# Altium footprint library Connector_Samtec_HLE_THT.PcbLib: 141 footprints (part 7 of 9)
Each footprint in its own frame and in the unit in brackets; x right, y up, seen from the top. Pads: shape width x height; smd on the part's side, far side on the other; paste and mask are expansions set on the pad; w line width, h text height; cw(c..) or ccw(c..) is an arc to the next point about the centre after c.
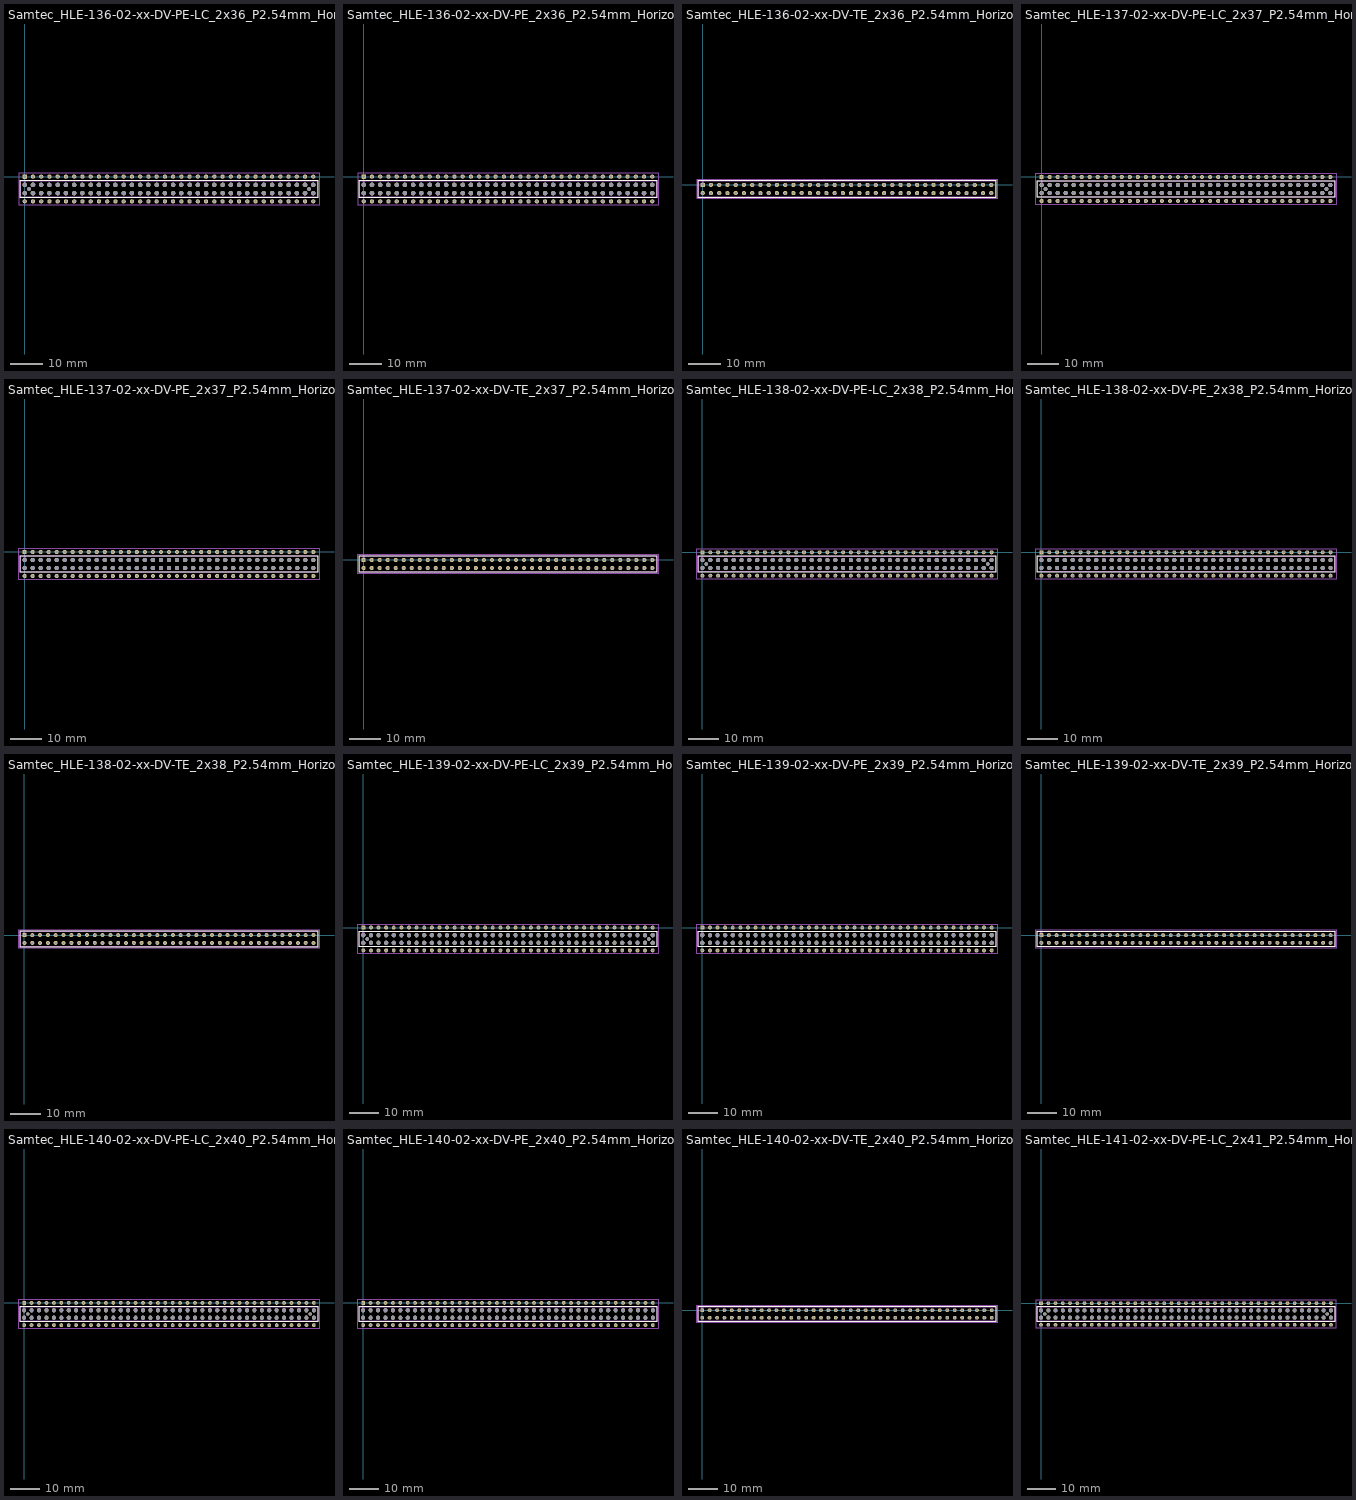
[diagram p6: the footprints below, top view; thin cyan lines are the x and y axes]

## Samtec_HLE-136-02-xx-DV-PE-LC_2x36_P2.54mm_Horizontal [mm]
pads (146):
  rrect19% 1.31x1.31 hole 0.71: 1(0,0)
  round 1.31 hole 0.71: 2(0,-7.62) 3(2.54,0) 4(2.54,-7.62) 5(5.08,0) 6(5.08,-7.62) 7(7.62,0) 8(7.62,-7.62) 9(10.16,0) 10(10.16,-7.62) 11(12.7,0) 12(12.7,-7.62) 13(15.24,0) 14(15.24,-7.62) 15(17.78,0) 16(17.78,-7.62) 17(20.32,0) 18(20.32,-7.62) 19(22.86,0) 20(22.86,-7.62) 21(25.4,0) 22(25.4,-7.62) 23(27.94,0) 24(27.94,-7.62) 25(30.48,0) 26(30.48,-7.62) 27(33.02,0) 28(33.02,-7.62) 29(35.56,0) 30(35.56,-7.62) 31(38.1,0) 32(38.1,-7.62) 33(40.64,0) 34(40.64,-7.62) 35(43.18,0) 36(43.18,-7.62) 37(45.72,0) 38(45.72,-7.62) 39(48.26,0) 40(48.26,-7.62) 41(50.8,0) 42(50.8,-7.62) 43(53.34,0) 44(53.34,-7.62) 45(55.88,0) 46(55.88,-7.62) 47(58.42,0) 48(58.42,-7.62) 49(60.96,0) 50(60.96,-7.62) 51(63.5,0) 52(63.5,-7.62) 53(66.04,0) 54(66.04,-7.62) 55(68.58,0) 56(68.58,-7.62) 57(71.12,0) 58(71.12,-7.62) 59(73.66,0) 60(73.66,-7.62) 61(76.2,0) 62(76.2,-7.62) 63(78.74,0) 64(78.74,-7.62) 65(81.28,0) 66(81.28,-7.62) 67(83.82,0) 68(83.82,-7.62) 69(86.36,0) 70(86.36,-7.62) 71(88.9,0) 72(88.9,-7.62)
  round 1.4 hole 1.4: Un1(55.88,-5.08) Un2(7.62,-2.54) Un3(10.16,-5.08) Un4(58.42,-5.08) Un5(58.42,-2.54) Un6(71.12,-5.08) Un7(27.94,-2.54) Un8(17.78,-5.08) Un9(20.32,-5.08) Un10(63.5,-5.08) Un11(27.94,-5.08) Un13(83.82,-5.08) Un14(78.74,-5.08) Un15(88.9,-2.54) Un16(30.48,-2.54) Un17(7.62,-5.08) Un18(22.86,-5.08) Un19(63.5,-2.54) Un20(60.96,-5.08) Un21(48.26,-2.54) Un22(66.04,-2.54) Un23(5.08,-2.54) Un24(53.34,-2.54) Un25(2.54,-2.54) Un26(35.56,-2.54) Un27(73.66,-5.08) Un28(10.16,-2.54) Un29(86.36,-5.08) Un30(76.2,-5.08) Un31(45.72,-2.54) Un32(12.7,-2.54) Un33(43.18,-2.54) Un35(22.86,-2.54) Un36(66.04,-5.08) Un37(15.24,-2.54) Un38(68.58,-2.54) Un39(38.1,-2.54) Un40(40.64,-2.54) Un41(68.58,-5.08) Un42(5.08,-5.08) Un43(53.34,-5.08) Un44(15.24,-5.08) Un45(88.9,-5.08) Un46(25.4,-2.54) Un47(2.54,-5.08) Un48(30.48,-5.08) Un49(33.02,-5.08) Un50(45.72,-5.08) Un51(40.64,-5.08) Un52(48.26,-5.08) Un53(76.2,-2.54) Un54(25.4,-5.08) Un55(17.78,-2.54) Un56(50.8,-2.54) Un57(81.28,-5.08) Un58(86.36,-2.54) Un59(0,-2.54) Un60(60.96,-2.54) Un61(35.56,-5.08) Un62(50.8,-5.08) Un63(55.88,-2.54) Un64(20.32,-2.54) Un65(83.82,-2.54) Un66(0,-5.08) Un67(33.02,-2.54) Un68(71.12,-2.54) Un69(81.28,-2.54) Un70(73.66,-2.54) Un71(38.1,-5.08) Un72(43.18,-5.08) Un73(12.7,-5.08) Un74(78.74,-2.54)
  round 1.19 hole 1.19: Un12(87.63,-3.81) Un34(1.27,-3.81)
F.SilkS:
  lines w0.12: -1.38,-6.46 -1.38,-1.16 90.28,-1.16 90.28,-6.46 -1.38,-6.46
F.CrtYd:
  lines w0.05: -1.77,-8.78 90.67,-8.78 90.67,1.16 -1.77,1.16 -1.77,-8.78
F.Fab:
  lines w0.1: -0.5,-1.27 0,-1.977 0.5,-1.27 ; -1.27,-6.35 90.17,-6.35 90.17,-1.27 -1.27,-1.27 -1.27,-6.35
  text "'.Designator'" at 40.403,-6.49 h1

## Samtec_HLE-136-02-xx-DV-PE_2x36_P2.54mm_Horizontal [mm]
pads (144):
  rrect19% 1.31x1.31 hole 0.71: 1(0,0)
  round 1.31 hole 0.71: 2(0,-7.62) 3(2.54,0) 4(2.54,-7.62) 5(5.08,0) 6(5.08,-7.62) 7(7.62,0) 8(7.62,-7.62) 9(10.16,0) 10(10.16,-7.62) 11(12.7,0) 12(12.7,-7.62) 13(15.24,0) 14(15.24,-7.62) 15(17.78,0) 16(17.78,-7.62) 17(20.32,0) 18(20.32,-7.62) 19(22.86,0) 20(22.86,-7.62) 21(25.4,0) 22(25.4,-7.62) 23(27.94,0) 24(27.94,-7.62) 25(30.48,0) 26(30.48,-7.62) 27(33.02,0) 28(33.02,-7.62) 29(35.56,0) 30(35.56,-7.62) 31(38.1,0) 32(38.1,-7.62) 33(40.64,0) 34(40.64,-7.62) 35(43.18,0) 36(43.18,-7.62) 37(45.72,0) 38(45.72,-7.62) 39(48.26,0) 40(48.26,-7.62) 41(50.8,0) 42(50.8,-7.62) 43(53.34,0) 44(53.34,-7.62) 45(55.88,0) 46(55.88,-7.62) 47(58.42,0) 48(58.42,-7.62) 49(60.96,0) 50(60.96,-7.62) 51(63.5,0) 52(63.5,-7.62) 53(66.04,0) 54(66.04,-7.62) 55(68.58,0) 56(68.58,-7.62) 57(71.12,0) 58(71.12,-7.62) 59(73.66,0) 60(73.66,-7.62) 61(76.2,0) 62(76.2,-7.62) 63(78.74,0) 64(78.74,-7.62) 65(81.28,0) 66(81.28,-7.62) 67(83.82,0) 68(83.82,-7.62) 69(86.36,0) 70(86.36,-7.62) 71(88.9,0) 72(88.9,-7.62)
  round 1.4 hole 1.4: Un1(55.88,-2.54) Un2(76.2,-2.54) Un3(63.5,-2.54) Un4(76.2,-5.08) Un5(43.18,-2.54) Un6(68.58,-5.08) Un7(12.7,-2.54) Un8(0,-2.54) Un9(10.16,-5.08) Un10(2.54,-2.54) Un11(48.26,-2.54) Un12(60.96,-2.54) Un13(73.66,-2.54) Un14(43.18,-5.08) Un15(81.28,-2.54) Un16(38.1,-2.54) Un17(78.74,-5.08) Un18(83.82,-2.54) Un19(53.34,-2.54) Un20(71.12,-2.54) Un21(88.9,-2.54) Un22(35.56,-2.54) Un23(10.16,-2.54) Un24(33.02,-2.54) Un25(22.86,-5.08) Un26(15.24,-5.08) Un27(63.5,-5.08) Un28(86.36,-5.08) Un29(25.4,-2.54) Un30(35.56,-5.08) Un31(45.72,-5.08) Un32(25.4,-5.08) Un33(20.32,-5.08) Un34(68.58,-2.54) Un35(38.1,-5.08) Un36(50.8,-2.54) Un37(20.32,-2.54) Un38(50.8,-5.08) Un39(17.78,-5.08) Un40(7.62,-5.08) Un41(15.24,-2.54) Un42(22.86,-2.54) Un43(2.54,-5.08) Un44(53.34,-5.08) Un45(30.48,-2.54) Un46(81.28,-5.08) Un47(45.72,-2.54) Un48(0,-5.08) Un49(40.64,-2.54) Un50(48.26,-5.08) Un51(86.36,-2.54) Un52(40.64,-5.08) Un53(33.02,-5.08) Un54(83.82,-5.08) Un55(78.74,-2.54) Un56(66.04,-5.08) Un57(27.94,-2.54) Un58(66.04,-2.54) Un59(58.42,-5.08) Un60(30.48,-5.08) Un61(55.88,-5.08) Un62(17.78,-2.54) Un63(73.66,-5.08) Un64(71.12,-5.08) Un65(5.08,-2.54) Un66(7.62,-2.54) Un67(88.9,-5.08) Un68(12.7,-5.08) Un69(5.08,-5.08) Un70(60.96,-5.08) Un71(27.94,-5.08) Un72(58.42,-2.54)
F.SilkS:
  lines w0.12: -1.38,-6.46 90.28,-6.46 90.28,-1.16 -1.38,-1.16 -1.38,-6.46
F.CrtYd:
  lines w0.05: -1.77,-8.78 -1.77,1.16 90.67,1.16 90.67,-8.78 -1.77,-8.78
F.Fab:
  lines w0.1: -0.5,-1.27 0,-1.977 0.5,-1.27 ; -1.27,-6.35 90.17,-6.35 90.17,-1.27 -1.27,-1.27 -1.27,-6.35
  text "'.Designator'" at 40.403,-6.49 h1

## Samtec_HLE-136-02-xx-DV-TE_2x36_P2.54mm_Horizontal [mm]
pads (72):
  rrect19% 1.31x1.31 hole 0.71: 1(0,0)
  round 1.31 hole 0.71: 2(0,-2.54) 3(2.54,0) 4(2.54,-2.54) 5(5.08,0) 6(5.08,-2.54) 7(7.62,0) 8(7.62,-2.54) 9(10.16,0) 10(10.16,-2.54) 11(12.7,0) 12(12.7,-2.54) 13(15.24,0) 14(15.24,-2.54) 15(17.78,0) 16(17.78,-2.54) 17(20.32,0) 18(20.32,-2.54) 19(22.86,0) 20(22.86,-2.54) 21(25.4,0) 22(25.4,-2.54) 23(27.94,0) 24(27.94,-2.54) 25(30.48,0) 26(30.48,-2.54) 27(33.02,0) 28(33.02,-2.54) 29(35.56,0) 30(35.56,-2.54) 31(38.1,0) 32(38.1,-2.54) 33(40.64,0) 34(40.64,-2.54) 35(43.18,0) 36(43.18,-2.54) 37(45.72,0) 38(45.72,-2.54) 39(48.26,0) 40(48.26,-2.54) 41(50.8,0) 42(50.8,-2.54) 43(53.34,0) 44(53.34,-2.54) 45(55.88,0) 46(55.88,-2.54) 47(58.42,0) 48(58.42,-2.54) 49(60.96,0) 50(60.96,-2.54) 51(63.5,0) 52(63.5,-2.54) 53(66.04,0) 54(66.04,-2.54) 55(68.58,0) 56(68.58,-2.54) 57(71.12,0) 58(71.12,-2.54) 59(73.66,0) 60(73.66,-2.54) 61(76.2,0) 62(76.2,-2.54) 63(78.74,0) 64(78.74,-2.54) 65(81.28,0) 66(81.28,-2.54) 67(83.82,0) 68(83.82,-2.54) 69(86.36,0) 70(86.36,-2.54) 71(88.9,0) 72(88.9,-2.54)
F.SilkS:
  lines w0.12: -1.38,-3.92 -1.38,1.38 90.28,1.38 90.28,-3.92 -1.38,-3.92
F.CrtYd:
  lines w0.05: -1.77,-4.31 90.67,-4.31 90.67,1.77 -1.77,1.77 -1.77,-4.31
F.Fab:
  lines w0.1: -0.5,1.27 0,0.563 0.5,1.27 ; -1.27,-3.81 -1.27,1.27 90.17,1.27 90.17,-3.81 -1.27,-3.81
  text "'.Designator'" at 40.403,-3.95 h1

## Samtec_HLE-137-02-xx-DV-PE-LC_2x37_P2.54mm_Horizontal [mm]
pads (150):
  rrect19% 1.31x1.31 hole 0.71: 1(0,0)
  round 1.31 hole 0.71: 2(0,-7.62) 3(2.54,0) 4(2.54,-7.62) 5(5.08,0) 6(5.08,-7.62) 7(7.62,0) 8(7.62,-7.62) 9(10.16,0) 10(10.16,-7.62) 11(12.7,0) 12(12.7,-7.62) 13(15.24,0) 14(15.24,-7.62) 15(17.78,0) 16(17.78,-7.62) 17(20.32,0) 18(20.32,-7.62) 19(22.86,0) 20(22.86,-7.62) 21(25.4,0) 22(25.4,-7.62) 23(27.94,0) 24(27.94,-7.62) 25(30.48,0) 26(30.48,-7.62) 27(33.02,0) 28(33.02,-7.62) 29(35.56,0) 30(35.56,-7.62) 31(38.1,0) 32(38.1,-7.62) 33(40.64,0) 34(40.64,-7.62) 35(43.18,0) 36(43.18,-7.62) 37(45.72,0) 38(45.72,-7.62) 39(48.26,0) 40(48.26,-7.62) 41(50.8,0) 42(50.8,-7.62) 43(53.34,0) 44(53.34,-7.62) 45(55.88,0) 46(55.88,-7.62) 47(58.42,0) 48(58.42,-7.62) 49(60.96,0) 50(60.96,-7.62) 51(63.5,0) 52(63.5,-7.62) 53(66.04,0) 54(66.04,-7.62) 55(68.58,0) 56(68.58,-7.62) 57(71.12,0) 58(71.12,-7.62) 59(73.66,0) 60(73.66,-7.62) 61(76.2,0) 62(76.2,-7.62) 63(78.74,0) 64(78.74,-7.62) 65(81.28,0) 66(81.28,-7.62) 67(83.82,0) 68(83.82,-7.62) 69(86.36,0) 70(86.36,-7.62) 71(88.9,0) 72(88.9,-7.62) 73(91.44,0) 74(91.44,-7.62)
  round 1.4 hole 1.4: Un1(81.28,-5.08) Un2(2.54,-5.08) Un3(43.18,-2.54) Un4(55.88,-5.08) Un5(25.4,-5.08) Un6(27.94,-2.54) Un7(17.78,-2.54) Un8(53.34,-5.08) Un9(48.26,-5.08) Un10(66.04,-5.08) Un11(76.2,-5.08) Un12(76.2,-2.54) Un14(83.82,-5.08) Un15(45.72,-5.08) Un16(71.12,-2.54) Un18(12.7,-5.08) Un19(86.36,-5.08) Un20(10.16,-5.08) Un21(91.44,-2.54) Un22(83.82,-2.54) Un23(7.62,-5.08) Un24(71.12,-5.08) Un25(43.18,-5.08) Un26(27.94,-5.08) Un27(7.62,-2.54) Un28(58.42,-5.08) Un29(10.16,-2.54) Un30(88.9,-5.08) Un31(53.34,-2.54) Un32(73.66,-5.08) Un33(60.96,-2.54) Un34(5.08,-5.08) Un35(33.02,-2.54) Un36(78.74,-5.08) Un37(55.88,-2.54) Un38(45.72,-2.54) Un39(58.42,-2.54) Un40(20.32,-5.08) Un41(15.24,-5.08) Un42(66.04,-2.54) Un43(2.54,-2.54) Un44(0,-5.08) Un45(30.48,-5.08) Un46(91.44,-5.08) Un47(50.8,-2.54) Un48(12.7,-2.54) Un49(38.1,-5.08) Un50(25.4,-2.54) Un51(68.58,-5.08) Un52(73.66,-2.54) Un53(60.96,-5.08) Un54(15.24,-2.54) Un55(40.64,-5.08) Un56(35.56,-5.08) Un57(20.32,-2.54) Un58(86.36,-2.54) Un59(30.48,-2.54) Un60(40.64,-2.54) Un61(48.26,-2.54) Un62(33.02,-5.08) Un63(81.28,-2.54) Un64(63.5,-2.54) Un65(0,-2.54) Un66(63.5,-5.08) Un67(50.8,-5.08) Un68(22.86,-2.54) Un69(5.08,-2.54) Un70(78.74,-2.54) Un71(38.1,-2.54) Un72(35.56,-2.54) Un73(22.86,-5.08) Un74(17.78,-5.08) Un75(68.58,-2.54) Un76(88.9,-2.54)
  round 1.19 hole 1.19: Un13(90.17,-3.81) Un17(1.27,-3.81)
F.SilkS:
  lines w0.12: -1.38,-6.46 -1.38,-1.16 92.82,-1.16 92.82,-6.46 -1.38,-6.46
F.CrtYd:
  lines w0.05: -1.77,-8.78 93.21,-8.78 93.21,1.16 -1.77,1.16 -1.77,-8.78
F.Fab:
  lines w0.1: -0.5,-1.27 0,-1.977 0.5,-1.27 ; -1.27,-6.35 -1.27,-1.27 92.71,-1.27 92.71,-6.35 -1.27,-6.35
  text "'.Designator'" at 41.673,-6.49 h1

## Samtec_HLE-137-02-xx-DV-PE_2x37_P2.54mm_Horizontal [mm]
pads (148):
  rrect19% 1.31x1.31 hole 0.71: 1(0,0)
  round 1.31 hole 0.71: 2(0,-7.62) 3(2.54,0) 4(2.54,-7.62) 5(5.08,0) 6(5.08,-7.62) 7(7.62,0) 8(7.62,-7.62) 9(10.16,0) 10(10.16,-7.62) 11(12.7,0) 12(12.7,-7.62) 13(15.24,0) 14(15.24,-7.62) 15(17.78,0) 16(17.78,-7.62) 17(20.32,0) 18(20.32,-7.62) 19(22.86,0) 20(22.86,-7.62) 21(25.4,0) 22(25.4,-7.62) 23(27.94,0) 24(27.94,-7.62) 25(30.48,0) 26(30.48,-7.62) 27(33.02,0) 28(33.02,-7.62) 29(35.56,0) 30(35.56,-7.62) 31(38.1,0) 32(38.1,-7.62) 33(40.64,0) 34(40.64,-7.62) 35(43.18,0) 36(43.18,-7.62) 37(45.72,0) 38(45.72,-7.62) 39(48.26,0) 40(48.26,-7.62) 41(50.8,0) 42(50.8,-7.62) 43(53.34,0) 44(53.34,-7.62) 45(55.88,0) 46(55.88,-7.62) 47(58.42,0) 48(58.42,-7.62) 49(60.96,0) 50(60.96,-7.62) 51(63.5,0) 52(63.5,-7.62) 53(66.04,0) 54(66.04,-7.62) 55(68.58,0) 56(68.58,-7.62) 57(71.12,0) 58(71.12,-7.62) 59(73.66,0) 60(73.66,-7.62) 61(76.2,0) 62(76.2,-7.62) 63(78.74,0) 64(78.74,-7.62) 65(81.28,0) 66(81.28,-7.62) 67(83.82,0) 68(83.82,-7.62) 69(86.36,0) 70(86.36,-7.62) 71(88.9,0) 72(88.9,-7.62) 73(91.44,0) 74(91.44,-7.62)
  round 1.4 hole 1.4: Un1(73.66,-2.54) Un2(30.48,-2.54) Un3(78.74,-2.54) Un4(33.02,-2.54) Un5(2.54,-2.54) Un6(63.5,-5.08) Un7(60.96,-5.08) Un8(83.82,-2.54) Un9(2.54,-5.08) Un10(48.26,-2.54) Un11(81.28,-5.08) Un12(60.96,-2.54) Un13(10.16,-5.08) Un14(15.24,-2.54) Un15(73.66,-5.08) Un16(22.86,-2.54) Un17(76.2,-5.08) Un18(58.42,-2.54) Un19(25.4,-5.08) Un20(50.8,-5.08) Un21(86.36,-2.54) Un22(53.34,-2.54) Un23(91.44,-2.54) Un24(30.48,-5.08) Un25(68.58,-2.54) Un26(53.34,-5.08) Un27(63.5,-2.54) Un28(68.58,-5.08) Un29(5.08,-5.08) Un30(45.72,-5.08) Un31(0,-5.08) Un32(40.64,-5.08) Un33(81.28,-2.54) Un34(91.44,-5.08) Un35(35.56,-5.08) Un36(55.88,-5.08) Un37(43.18,-5.08) Un38(48.26,-5.08) Un39(17.78,-2.54) Un40(86.36,-5.08) Un41(66.04,-2.54) Un42(55.88,-2.54) Un43(88.9,-2.54) Un44(12.7,-5.08) Un45(50.8,-2.54) Un46(7.62,-5.08) Un47(66.04,-5.08) Un48(12.7,-2.54) Un49(27.94,-2.54) Un50(20.32,-2.54) Un51(43.18,-2.54) Un52(25.4,-2.54) Un53(27.94,-5.08) Un54(71.12,-2.54) Un55(40.64,-2.54) Un56(15.24,-5.08) Un57(76.2,-2.54) Un58(83.82,-5.08) Un59(20.32,-5.08) Un60(7.62,-2.54) Un61(10.16,-2.54) Un62(17.78,-5.08) Un63(5.08,-2.54) Un64(33.02,-5.08) Un65(0,-2.54) Un66(38.1,-5.08) Un67(58.42,-5.08) Un68(71.12,-5.08) Un69(78.74,-5.08) Un70(88.9,-5.08) Un71(35.56,-2.54) Un72(22.86,-5.08) Un73(45.72,-2.54) Un74(38.1,-2.54)
F.SilkS:
  lines w0.12: -1.38,-6.46 -1.38,-1.16 92.82,-1.16 92.82,-6.46 -1.38,-6.46
F.CrtYd:
  lines w0.05: -1.77,-8.78 93.21,-8.78 93.21,1.16 -1.77,1.16 -1.77,-8.78
F.Fab:
  lines w0.1: -0.5,-1.27 0,-1.977 0.5,-1.27 ; -1.27,-6.35 92.71,-6.35 92.71,-1.27 -1.27,-1.27 -1.27,-6.35
  text "'.Designator'" at 41.673,-6.49 h1

## Samtec_HLE-137-02-xx-DV-TE_2x37_P2.54mm_Horizontal [mm]
pads (74):
  rrect19% 1.31x1.31 hole 0.71: 1(0,0)
  round 1.31 hole 0.71: 2(0,-2.54) 3(2.54,0) 4(2.54,-2.54) 5(5.08,0) 6(5.08,-2.54) 7(7.62,0) 8(7.62,-2.54) 9(10.16,0) 10(10.16,-2.54) 11(12.7,0) 12(12.7,-2.54) 13(15.24,0) 14(15.24,-2.54) 15(17.78,0) 16(17.78,-2.54) 17(20.32,0) 18(20.32,-2.54) 19(22.86,0) 20(22.86,-2.54) 21(25.4,0) 22(25.4,-2.54) 23(27.94,0) 24(27.94,-2.54) 25(30.48,0) 26(30.48,-2.54) 27(33.02,0) 28(33.02,-2.54) 29(35.56,0) 30(35.56,-2.54) 31(38.1,0) 32(38.1,-2.54) 33(40.64,0) 34(40.64,-2.54) 35(43.18,0) 36(43.18,-2.54) 37(45.72,0) 38(45.72,-2.54) 39(48.26,0) 40(48.26,-2.54) 41(50.8,0) 42(50.8,-2.54) 43(53.34,0) 44(53.34,-2.54) 45(55.88,0) 46(55.88,-2.54) 47(58.42,0) 48(58.42,-2.54) 49(60.96,0) 50(60.96,-2.54) 51(63.5,0) 52(63.5,-2.54) 53(66.04,0) 54(66.04,-2.54) 55(68.58,0) 56(68.58,-2.54) 57(71.12,0) 58(71.12,-2.54) 59(73.66,0) 60(73.66,-2.54) 61(76.2,0) 62(76.2,-2.54) 63(78.74,0) 64(78.74,-2.54) 65(81.28,0) 66(81.28,-2.54) 67(83.82,0) 68(83.82,-2.54) 69(86.36,0) 70(86.36,-2.54) 71(88.9,0) 72(88.9,-2.54) 73(91.44,0) 74(91.44,-2.54)
F.SilkS:
  lines w0.12: -1.38,-3.92 -1.38,1.38 92.82,1.38 92.82,-3.92 -1.38,-3.92
F.CrtYd:
  lines w0.05: -1.77,-4.31 93.21,-4.31 93.21,1.77 -1.77,1.77 -1.77,-4.31
F.Fab:
  lines w0.1: -0.5,1.27 0,0.563 0.5,1.27 ; -1.27,-3.81 92.71,-3.81 92.71,1.27 -1.27,1.27 -1.27,-3.81
  text "'.Designator'" at 41.673,-3.95 h1

## Samtec_HLE-138-02-xx-DV-PE-LC_2x38_P2.54mm_Horizontal [mm]
pads (154):
  rrect19% 1.31x1.31 hole 0.71: 1(0,0)
  round 1.31 hole 0.71: 2(0,-7.62) 3(2.54,0) 4(2.54,-7.62) 5(5.08,0) 6(5.08,-7.62) 7(7.62,0) 8(7.62,-7.62) 9(10.16,0) 10(10.16,-7.62) 11(12.7,0) 12(12.7,-7.62) 13(15.24,0) 14(15.24,-7.62) 15(17.78,0) 16(17.78,-7.62) 17(20.32,0) 18(20.32,-7.62) 19(22.86,0) 20(22.86,-7.62) 21(25.4,0) 22(25.4,-7.62) 23(27.94,0) 24(27.94,-7.62) 25(30.48,0) 26(30.48,-7.62) 27(33.02,0) 28(33.02,-7.62) 29(35.56,0) 30(35.56,-7.62) 31(38.1,0) 32(38.1,-7.62) 33(40.64,0) 34(40.64,-7.62) 35(43.18,0) 36(43.18,-7.62) 37(45.72,0) 38(45.72,-7.62) 39(48.26,0) 40(48.26,-7.62) 41(50.8,0) 42(50.8,-7.62) 43(53.34,0) 44(53.34,-7.62) 45(55.88,0) 46(55.88,-7.62) 47(58.42,0) 48(58.42,-7.62) 49(60.96,0) 50(60.96,-7.62) 51(63.5,0) 52(63.5,-7.62) 53(66.04,0) 54(66.04,-7.62) 55(68.58,0) 56(68.58,-7.62) 57(71.12,0) 58(71.12,-7.62) 59(73.66,0) 60(73.66,-7.62) 61(76.2,0) 62(76.2,-7.62) 63(78.74,0) 64(78.74,-7.62) 65(81.28,0) 66(81.28,-7.62) 67(83.82,0) 68(83.82,-7.62) 69(86.36,0) 70(86.36,-7.62) 71(88.9,0) 72(88.9,-7.62) 73(91.44,0) 74(91.44,-7.62) 75(93.98,0) 76(93.98,-7.62)
  round 1.4 hole 1.4: Un1(68.58,-5.08) Un2(76.2,-5.08) Un3(71.12,-5.08) Un4(7.62,-5.08) Un5(33.02,-2.54) Un7(58.42,-5.08) Un8(55.88,-2.54) Un9(86.36,-5.08) Un10(38.1,-2.54) Un11(7.62,-2.54) Un12(78.74,-2.54) Un13(48.26,-2.54) Un14(86.36,-2.54) Un15(45.72,-5.08) Un16(2.54,-2.54) Un17(27.94,-5.08) Un18(53.34,-5.08) Un20(22.86,-5.08) Un21(10.16,-5.08) Un22(48.26,-5.08) Un23(15.24,-2.54) Un24(50.8,-5.08) Un25(60.96,-5.08) Un26(60.96,-2.54) Un27(22.86,-2.54) Un28(25.4,-5.08) Un29(2.54,-5.08) Un30(35.56,-5.08) Un31(68.58,-2.54) Un32(71.12,-2.54) Un33(0,-5.08) Un34(93.98,-5.08) Un35(35.56,-2.54) Un36(12.7,-5.08) Un37(88.9,-2.54) Un38(33.02,-5.08) Un39(27.94,-2.54) Un40(5.08,-2.54) Un41(93.98,-2.54) Un42(81.28,-5.08) Un43(0,-2.54) Un44(63.5,-5.08) Un45(66.04,-2.54) Un46(66.04,-5.08) Un47(81.28,-2.54) Un48(88.9,-5.08) Un49(40.64,-5.08) Un50(43.18,-2.54) Un51(55.88,-5.08) Un52(53.34,-2.54) Un53(91.44,-2.54) Un54(5.08,-5.08) Un55(91.44,-5.08) Un56(63.5,-2.54) Un57(76.2,-2.54) Un58(73.66,-2.54) Un59(40.64,-2.54) Un60(38.1,-5.08) Un61(83.82,-5.08) Un62(12.7,-2.54) Un63(20.32,-5.08) Un64(43.18,-5.08) Un65(83.82,-2.54) Un66(20.32,-2.54) Un67(30.48,-5.08) Un68(15.24,-5.08) Un69(45.72,-2.54) Un70(17.78,-2.54) Un71(17.78,-5.08) Un72(78.74,-5.08) Un73(50.8,-2.54) Un74(73.66,-5.08) Un75(10.16,-2.54) Un76(25.4,-2.54) Un77(30.48,-2.54) Un78(58.42,-2.54)
  round 1.19 hole 1.19: Un6(92.71,-3.81) Un19(1.27,-3.81)
F.SilkS:
  lines w0.12: -1.38,-6.46 95.36,-6.46 95.36,-1.16 -1.38,-1.16 -1.38,-6.46
F.CrtYd:
  lines w0.05: -1.77,-8.78 -1.77,1.16 95.75,1.16 95.75,-8.78 -1.77,-8.78
F.Fab:
  lines w0.1: -0.5,-1.27 0,-1.977 0.5,-1.27 ; -1.27,-6.35 -1.27,-1.27 95.25,-1.27 95.25,-6.35 -1.27,-6.35
  text "'.Designator'" at 42.943,-6.49 h1
